# Altium footprint library lib_protel_HC_BOINA.PCBLIB: 726 footprints (part 10 of 46)
Each footprint in its own frame and in the unit in brackets; x right, y up, seen from the top. Pads: shape width x height; smd on the part's side, far side on the other; paste and mask are expansions set on the pad; w line width, h text height; cw(c..) or ccw(c..) is an arc to the next point about the centre after c.
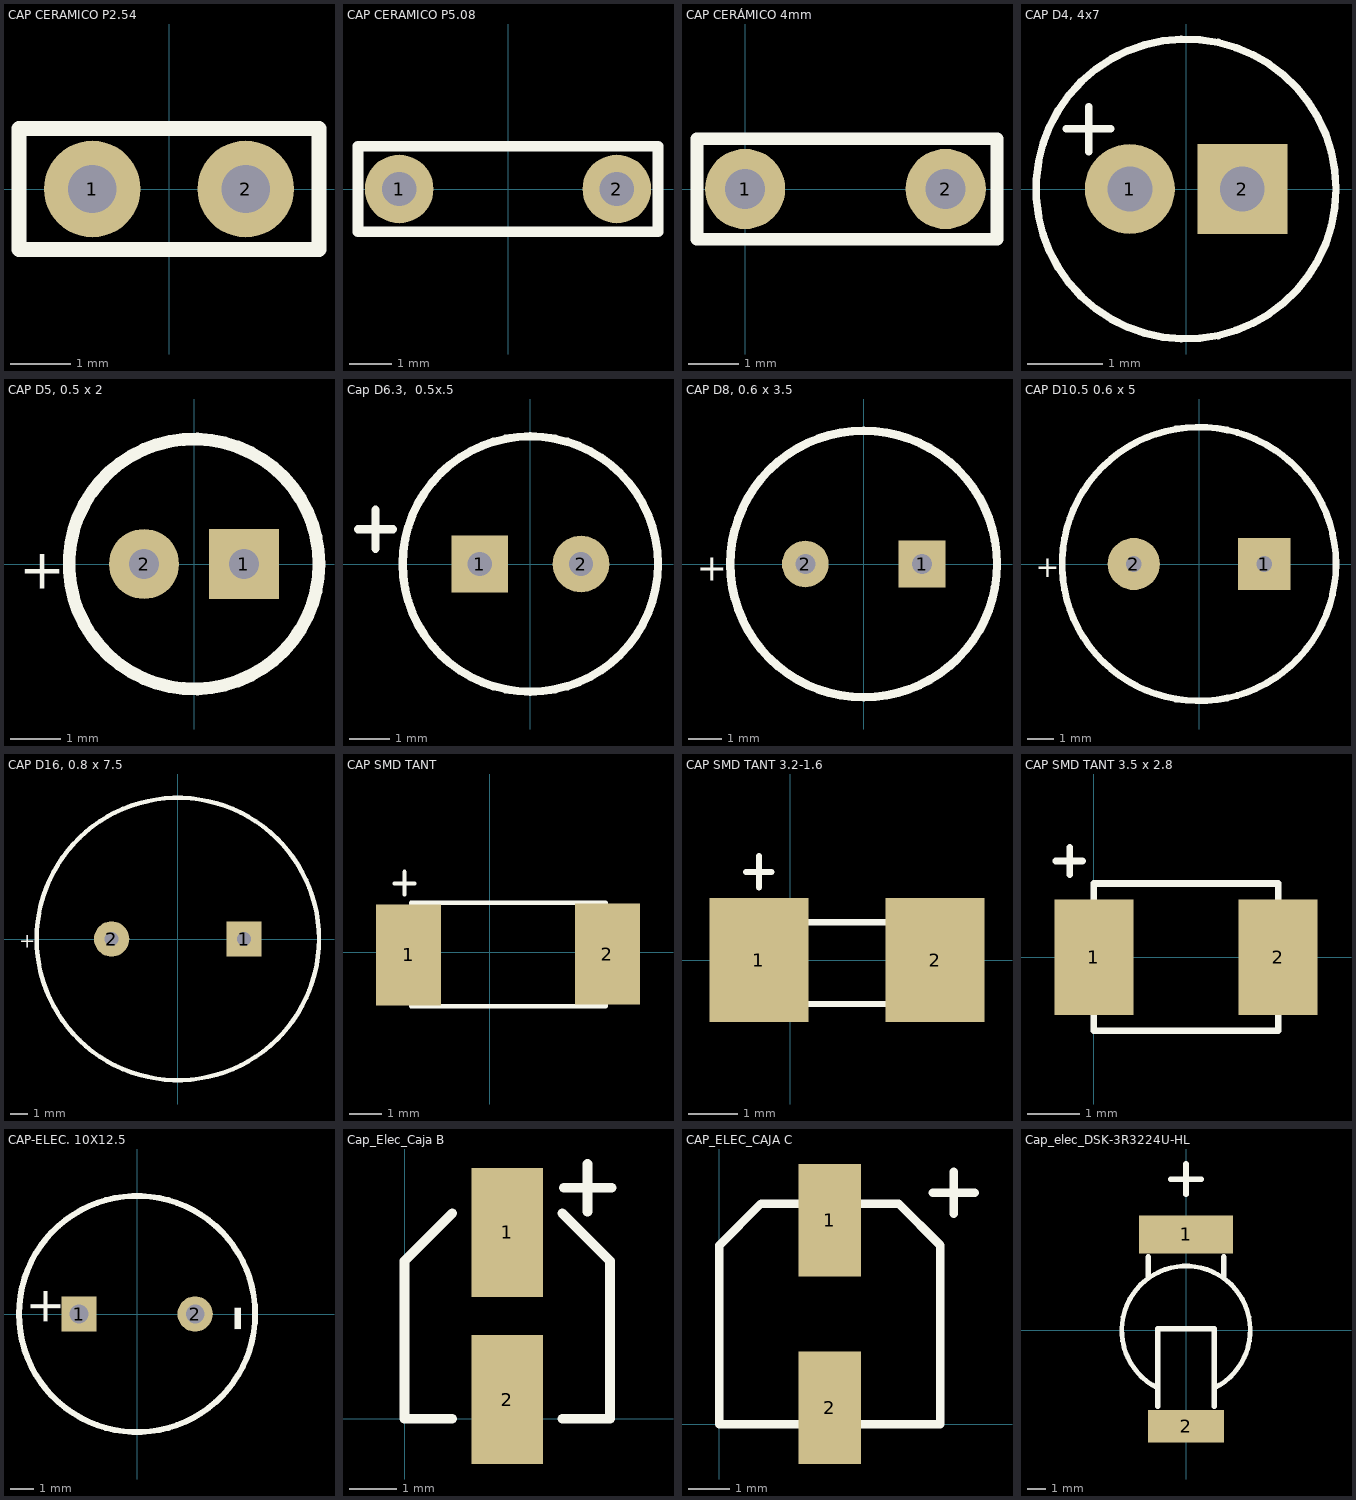
[diagram p9: the footprints below, top view; thin cyan lines are the x and y axes]

## CAP CERAMICO P2.54 [mm]
pads (2):
  round 1.6 hole 0.8: 1(-1.27,0) 2(1.27,0)
Top Overlay:
  lines w0.25: -2.484,-1 -2.484,1 2.484,1 2.484,-1 -2.484,-1

## CAP CERAMICO P5.08 [mm]
pads (2):
  round 1.6 hole 0.8: 1(-2.54,0) 2(2.54,0)
Top Overlay:
  lines w0.25: -3.5,-1 -3.5,1 3.5,1 3.5,-1 -3.5,-1

## CAP CERÁMICO 4mm [mm]
height 10
pads (2):
  round 1.6 hole 0.8: 1(0,0) 2(4,0)
Top Overlay:
  lines w0.25: -0.96,-1 -0.96,1 5.024,1 5.024,-1 -0.96,-1

## CAP D4, 4x7 [mm]
height 7
pads (2):
  round 1.2 hole 0.6: 1(-0.75,0)
  rect 1.2x1.2 hole 0.6: 2(0.75,0)
Top Overlay:
  circle w0.1: c0,0 r2
  lines w0.1: -1.6,0.8 -1,0.8 ; -1.3,0.5 -1.3,1.1

## CAP D5, 0.5 x 2 [mm]
pads (2):
  rect 1.4x1.4 hole 0.6: 1(1,0)
  round 1.4 hole 0.6: 2(-1,0)
Top Overlay:
  circle w0.254: c0,0 r2.5
  text "+" at -3.5,-0.5 h0.8

## Cap D6.3,  0.5x.5 [mm]
height 11
pads (2):
  rect 1.4x1.4 hole 0.6: 1(-1.25,0)
  round 1.4 hole 0.6: 2(1.25,0)
Top Overlay:
  circle w0.203: c0,0 r3.15
  lines w0.203: -4.253,0.857 -3.39,0.857 ; -3.822,0.374 -3.822,1.34

## CAP D8, 0.6 x 3.5 [mm]
pads (2):
  rect 1.4x1.4 hole 0.6: 1(1.75,0)
  round 1.4 hole 0.6: 2(-1.75,0)
Top Overlay:
  circle w0.254: c0,0 r4
  text "+" at -5,-0.5 h0.8

## CAP D10.5 0.6 x 5 [mm]
pads (2):
  rect 2x2 hole 0.6: 1(2.5,0)
  round 2 hole 0.6: 2(-2.5,0)
Top Overlay:
  circle w0.254: c0,0 r5.25
  text "+" at -6.25,-0.5 h0.8

## CAP D16, 0.8 x 7.5 [mm]
pads (2):
  rect 2x2 hole 0.8: 1(3.75,0)
  round 2 hole 0.8: 2(-3.75,0)
Top Overlay:
  circle w0.254: c0,0 r8
  text "+" at -9,-0.5 h0.8

## CAP SMD TANT [mm] "COND SMD TANTALUM 22uF 6.3V"
pads (2):
  rect 2x3.1 smd: 1(-2.489,-0.076) 2(3.607,-0.051)
Top Overlay:
  lines w0.127: -2.921,2.108 -2.311,2.108 ; -2.616,1.777 -2.616,2.475 ; -2.413,-1.651 1.778,-1.651 3.556,-1.651 3.556,0 3.556,1.524 0,1.524 -2.413,1.524 -2.413,-1.651

## CAP SMD TANT 3.2-1.6 [mm] "CONDENS TANTALUM LONG 3.2 Y ANCHURA 1.6"
pads (2):
  rect 2x2.5 smd: 1(-0.635,0) 2(2.921,0)
Top Overlay:
  lines w0.127: -0.889,1.778 -0.381,1.778 ; -0.635,1.472 -0.635,2.1 ; -0.508,-0.889 -0.508,0.762 2.794,0.762 2.794,-0.889 -0.508,-0.889

## CAP SMD TANT 3.5 x 2.8 [mm] "CONDENS TANTALUM LONG 3.5 Y ANCHURA 2.8"
height 1.9
pads (2):
  rect 1.5x2.2 smd: 1(0,0) 2(3.5,0)
Top Overlay:
  lines w0.127: -0.724,1.828 -0.216,1.828 ; -0.46,1.572 -0.46,2.09 ; 0,-1.4 0,1.4 3.5,1.4 3.5,-1.4 0,-1.4

## CAP-ELEC. 10X12.5 [mm]
height 14.986
pads (2):
  rect 1.524x1.524 hole 0.8: 1(-2.5,0)
  round 1.524 hole 0.8: 2(2.5,0)
Top Overlay:
  circle w0.254: c0,0 r5.084
  text "+" at -3.29,-0.558 h1.52
  text "-" at 5.293,-0.839 h2.54
3D body: height 0, standoff -3.81, extent -1.955,-0.202 -1.55,0.203
3D body: height 0, standoff -3.81, extent 1.55,-0.202 1.955,0.203

## Cap_Elec_Caja B [mm] "DxL = 4x5.4"
height 5.4
pads (2):
  rect 1.5x2.7 smd: 1(2.15,3.9) 2(2.15,0.4)
Top Overlay:
  lines w0.1: 0,3.3 0,3.3 ; 0,3.3 0,3.3
  lines w0.203: 1,0 0,0 0,3.3 1,4.3 ; 3.3,0 4.3,0 4.3,3.3 3.3,4.3 ; 3.33,4.83 4.33,4.83 ; 3.83,4.33 3.83,5.33
3D body "SW3dPS-CAPSMD4x5_5.STEP": height 5.52, standoff -0.4, extent -0.009,-0.748 4.31,4.891

## CAP_ELEC_CAJA C [mm]
height 5.4
pads (2):
  rect 1.5x2.7 smd: 1(2.65,4.9) 2(2.65,0.4)
Top Overlay:
  lines w0.1: 0,3.3 0,3.3 ; 0,3.3 0,3.3
  lines w0.203: 5.123,5.559 6.123,5.559 ; 5.623,5.059 5.623,6.059 ; 0,0 5.3,0 5.3,4.3 4.3,5.3 1,5.3 0,4.3 0,0

## Cap_elec_DSK-3R3224U-HL [mm] "Super cap 220mF"
height 2.8
pads (2):
  rect 5x2 smd: 1(0,5.075)
  rect 4x1.7 smd: 2(0,-5.075)
Top Overlay:
  lines w0.254: -1.521,-3.041 cw(c0,0) 1.521,-3.041
  lines w0.3: -2,2.775 -2,3.875 ; -1.5,-4.025 -1.5,0.075 1.5,0.075 1.5,-4.025 ; -0.8,8 0.8,8 ; 0,7.2 0,8.8 ; 2,2.775 2,3.875